# Altium footprint library IntLib.PcbLib: 221 footprints (part 1 of 14)
Each footprint in its own frame and in the unit in brackets; x right, y up, seen from the top. Pads: shape width x height; smd on the part's side, far side on the other; paste and mask are expansions set on the pad; w line width, h text height; cw(c..) or ccw(c..) is an arc to the next point about the centre after c.
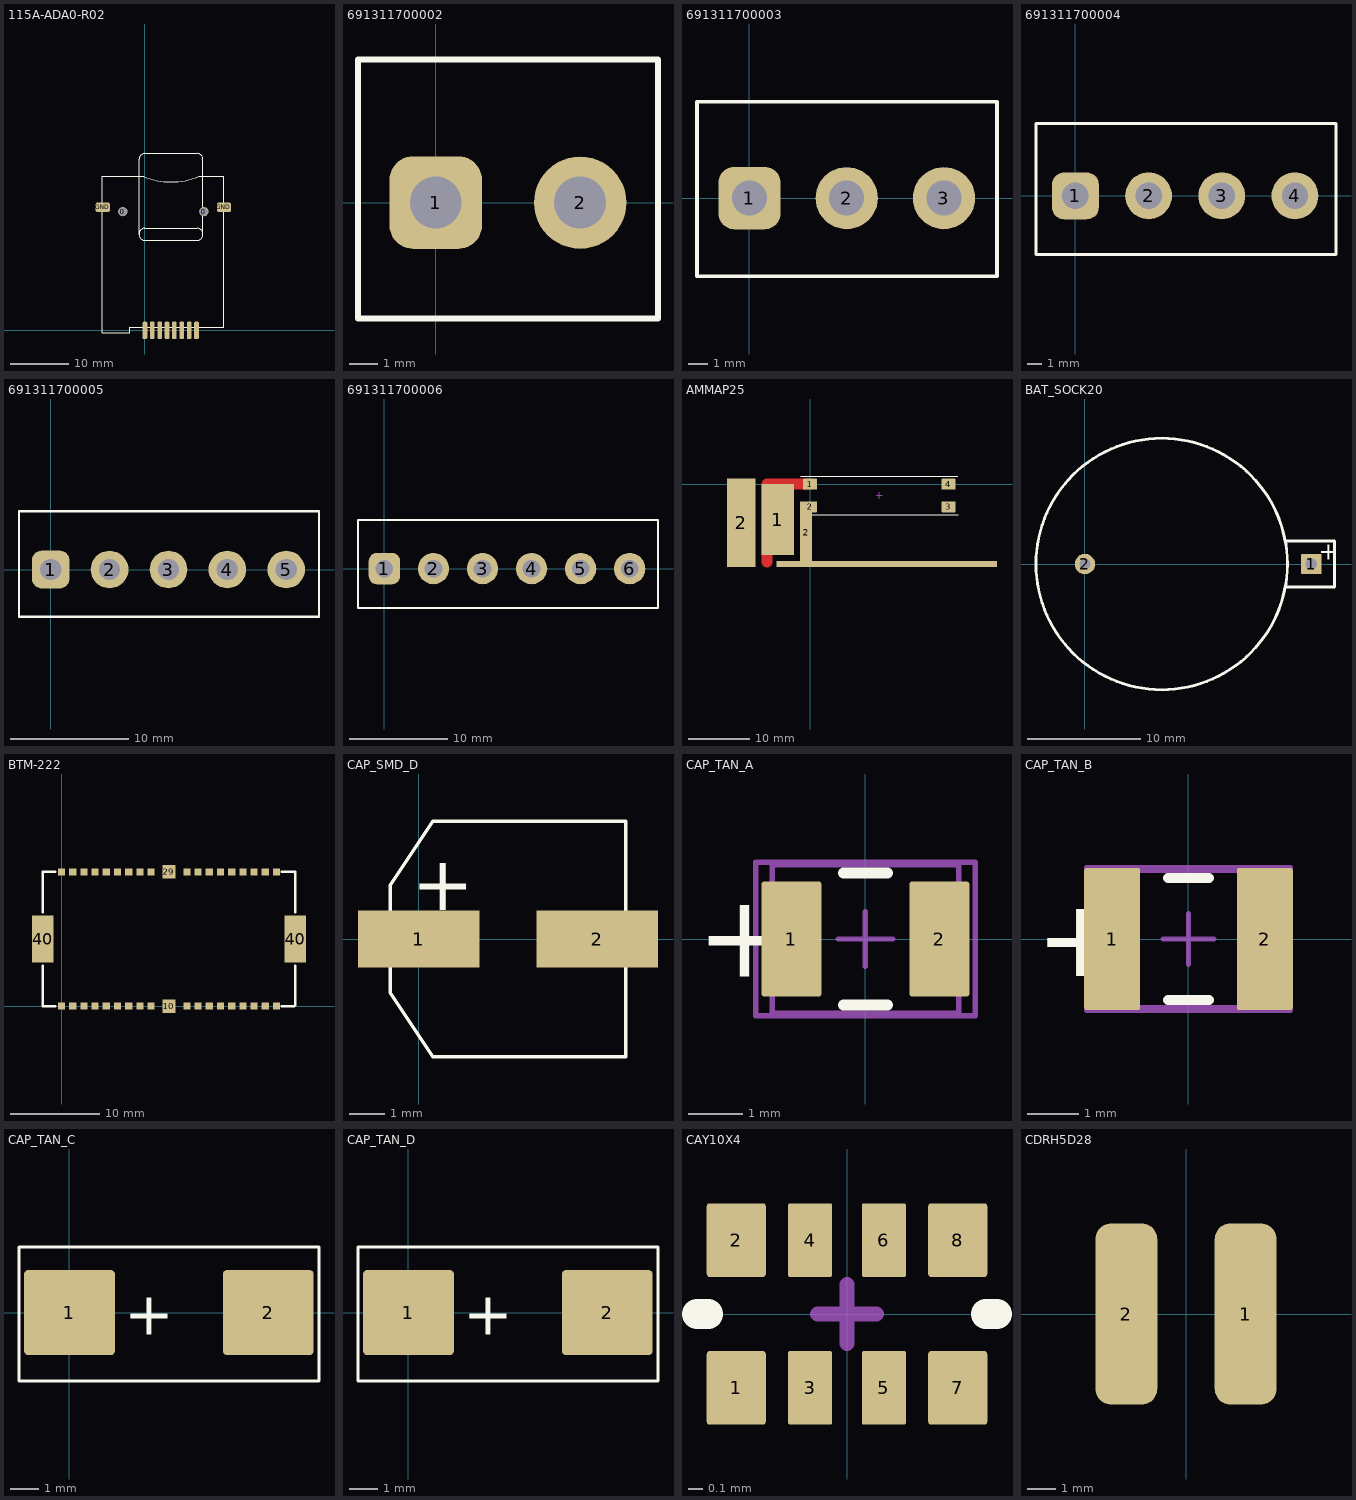
[diagram p0: the footprints below, top view; thin cyan lines are the x and y axes]

## 115A-ADA0-R02 [mm] "Attend SIM-Holder SMD"
height 1.9
pads (12):
  round 1.6 hole 1.5 unplated: 0(-3.83,20.5) 0(10.17,20.5)
  rrect50% 0.8x3 smd: C1(0,0) C2(2.54,0) C3(5.08,0) C5(1.27,0) C6(3.81,0) C7(6.35,0) CD(7.62,0) COM(8.89,0)
  rrect50% 2.5x1.7 smd: GND(-7.3,21.25) GND(13.65,21.25)
Top Overlay:
  lines w0.1: -1,16.645 cw(c0,16.645) 0,17.645 9,17.645 cw(c9,16.645) 10,16.645 ; -7.391,-0.455 -2.591,-0.455 -2.591,0.545 13.64,0.545 13.64,26.568 9.25,26.568 cw(c4.5,37.968) -0.25,26.568 -7.391,26.568 -7.391,-0.455 ; -1,16.545 ccw(c0,16.545) 0,15.545 9,15.545 ccw(c9,16.545) 10,16.545 10,29.545 ccw(c9,29.545) 9,30.545 0,30.545 ccw(c0,29.545) -1,29.545 -1,16.545
3D body: height 1.8, standoff 0, extent -7.31,-0.495 13.64,26.505

## 691311700002 [mm] "WR-TBL Series 3117 - 5.00 mm 2 pins Open Vertical PCB Header"
height 12
pads (2):
  rrect50% 3.2x3.2 hole 1.8: 1(0,0)
  round 3.2 hole 1.8: 2(5,0)
Top Overlay:
  lines w0.2: -2.692,-4.013 -2.692,4.953 7.696,4.953 7.696,-4.013 -2.692,-4.013
  text "." at -2.21,-3.454 h1.27
3D body: height 12, standoff -4, extent -2.511,-3.81 7.489,4.69

## 691311700003 [mm] "WR-TBL Series 3117 - 5.00 mm 3 pins Open Vertical PCB Header"
height 12
pads (3):
  rrect50% 3.2x3.2 hole 1.8: 1(0,0)
  round 3.2 hole 1.8: 2(5,0) 3(10,0)
Top Overlay:
  lines w0.2: -2.692,-4.013 12.725,-4.013 12.725,4.953 -2.692,4.953 -2.692,-4.013
  text "." at -2.21,-3.454 h1.27
3D body: height 12, standoff -4, extent -2.489,-3.759 12.511,4.741

## 691311700004 [mm] "WR-TBL Series 3117 - 5.00 mm 4 pins Open Vertical PCB Header"
height 12
pads (4):
  rrect50% 3.2x3.2 hole 1.8: 1(0,0)
  round 3.2 hole 1.8: 2(5,0) 3(10,0) 4(15,0)
Top Overlay:
  lines w0.2: -2.692,-4.013 17.805,-4.013 17.805,4.953 -2.692,4.953 -2.692,-4.013
  text "." at -2.21,-3.454 h1.27
3D body: height 12, standoff -4, extent -2.464,-3.759 17.536,4.741

## 691311700005 [mm] "WR-TBL Series 3117 - 5.00 mm 5 pins Open Vertical PCB Header"
height 12
pads (5):
  rrect50% 3.2x3.2 hole 1.8: 1(0,0)
  round 3.2 hole 1.8: 2(5,0) 3(10,0) 4(15,0) 5(20,0)
Top Overlay:
  lines w0.2: -2.692,-4.013 -2.692,4.953 22.784,4.953 22.784,-4.013 -2.692,-4.013
  text "." at -2.21,-3.454 h1.27
3D body: height 12, standoff -4, extent -2.464,-3.785 22.536,4.715

## 691311700006 [mm] "WR-TBL Series 3117 - 5.00 mm 6 pins Open Vertical PCB Header"
height 12
pads (6):
  rrect50% 3.2x3.2 hole 1.8: 1(0,0)
  round 3.2 hole 1.8: 2(5,0) 3(10,0) 4(15,0) 5(20,0) 6(25,0)
Top Overlay:
  lines w0.2: -2.692,-4.013 -2.692,4.953 27.889,4.953 27.889,-4.013 -2.692,-4.013
  text "." at -2.21,-3.454 h1.27
3D body: height 12, standoff -4, extent -2.413,-3.759 27.587,4.741

## AMMAP25 [mm] "Chip Antenna; Body 25.0x5.5mm (LxW)"
height 1.016
pads (8):
  rrect2% 5.3x11.6 smd: 1(-5.3,-5.8)
  rrect10% 2.3x1.8 smd: 1(0,0) 2(0,-3.7) 3(22.7,-3.7) 4(22.7,0)
  rrect2% 4.69x14.464 smd: 2(-11.295,-6.332)
  rrect2% 2x10.281 smd: 2(-0.65,-7.94)
  rrect2% 36.136x0.964 smd: 2(12.582,-13.082)
Top Layer:
  lines w1.8: -7.061,-12.725 -7.061,0 0,0
Top Overlay:
  lines w0.2: -1.528,1.325 24.253,1.325 ; -1.477,-5.025 24.304,-5.025
Mechanical 15:
  lines w0.1: 10.85,-1.85 11.85,-1.85 ; 11.35,-2.35 11.35,-1.35
3D body: height 0.6, standoff 0, extent -1.096,-4.517 23.771,0.817
3D body: height 4.3, standoff 0.1, extent -1.096,-4.517 2.968,0.817
3D body: height 4.4, standoff 2.6, extent -1.096,-4.517 23.771,0.817
3D body: height 4.3, standoff 0.1, extent 19.707,-4.517 23.771,0.817

## BAT_SOCK20 [mm]
pads (2):
  rrect10% 1.8x1.8 hole 1: 1(20,-0.005)
  round 1.8 hole 1: 2(0,-0.005)
Top Overlay:
  circle w0.254: c6.779,0 r11.102
  lines w0.254: 17.78,-2.037 22.047,-2.037 22.047,2.027 17.78,2.027
  text "+" at 20.65,0.356 h1.52
3D body: height 7, standoff 3.8, extent -3.226,-9.997 16.774,10.003
3D body: height 8.67, standoff -3.5, extent -4.731,-11.454 22.7,11.546

## BTM-222 [mm]
pads (40):
  rect 0.8x0.8 smd: 1(0,0) 2(1.25,0) 3(2.5,0) 4(3.75,0) 5(5,0) 6(6.25,0) 7(7.5,0) 8(8.75,0) 9(10,0) 11(14,0) 12(15.25,0) 13(16.5,0) 14(17.75,0) 15(19,0) 16(20.25,0) 17(21.5,0) 18(22.75,0) 19(24,0) 20(24,15) 21(22.75,15) 22(21.5,15) 23(20.25,15) 24(19,15) 25(17.75,15) 26(16.5,15) 27(15.25,15) 28(14,15) 30(10,15) 31(8.75,15) 32(7.5,15) 33(6.25,15) 34(5,15) 35(3.75,15) 36(2.5,15) 37(1.25,15) 38(0,15)
  rect 1.5x1.5 smd: 10(12,0) 29(12,15)
  rect 2.4x5.3 smd: 40(-2.1,7.5) 40(26.1,7.5)
Top Overlay:
  lines w0.254: -2.1,4.5 -2.1,0 -0.7,0 ; -2.1,10.5 -2.1,15 -0.7,15 ; 24.6,0 26,0 26.1,0.1 26.1,4.5 ; 24.6,15 26.1,15 26.1,10.5
3D body: height 2.8, standoff -0.05, extent -2.134,0 26.166,15.1

## CAP_SMD_D [mm]
pads (2):
  rect 3.4x1.6 smd: 1(0,0) 2(5,0)
Top Overlay:
  lines w0.1: -0.8,-1.5 -0.8,1.5 0.4,3.3 5.8,3.3 5.8,-3.3 0.4,-3.3 -0.8,-1.5
  text "+" at -0.2,0.8 h1.52
3D body: height 7.71, standoff -0.01, extent -0.985,-3.277 6.015,3.323

## CAP_TAN_A [mm] "Chip Capacitor, Body 3.2x2.5mm, IPC High Density"
height 1.5
pads (2):
  rrect10% 1.1x2.1 smd: 1(-1.35,0) 2(1.35,0)
Top Overlay:
  lines w0.2: -0.4,-1.2 0.4,-1.2 ; -0.4,1.2 0.4,1.2
  text "+" at -3.073,-0.686 h1.52
Mechanical 13:
  lines w0.1: -1.7,-1.35 1.7,-1.35 1.7,1.35 -1.7,1.35 -1.7,-1.35
Mechanical 15:
  lines w0.1: -0.5,0 0.5,0 ; 0,-0.5 0,0.5 ; -2,-1.4 2,-1.4 2,1.4 -2,1.4 -2,-1.4
3D body: height 1.65, standoff 0, extent -1.7,-0.737 1.69,0.863

## CAP_TAN_B [mm] "Chip Capacitor, Body 3.2x2.5mm, IPC High Density"
height 1.5
pads (2):
  rrect10% 1.1x2.8 smd: 1(-1.5,0) 2(1.5,0)
Top Overlay:
  lines w0.2: -0.4,-1.2 0.4,-1.2 ; -0.4,1.2 0.4,1.2
  text "+" at -2.997,-0.737 h1.52
Mechanical 13:
  lines w0.1: -1.7,-1.35 -1.7,1.35 1.7,1.35 1.7,-1.35 -1.7,-1.35
Mechanical 15:
  lines w0.1: -0.5,0 0.5,0 ; 0,-0.5 0,0.5 ; -2,-1.4 -2,1.4 2,1.4 2,-1.4 -2,-1.4
3D body: height 2.14, standoff 0.04, extent -1.753,-1.422 1.938,1.398

## CAP_TAN_C [mm]
pads (2):
  rrect10% 3.2x3 smd: 1(0,0) 2(7,0)
Top Overlay:
  lines w0.1: -1.778,-2.413 -1.778,2.311 8.788,2.311 8.788,-2.413 -1.778,-2.413
  text "+" at 1.93,-0.787 h1.52
3D body: height 3, standoff 0, extent -0.119,-2.24 7.281,2.21

## CAP_TAN_D [mm]
pads (2):
  rrect10% 3.2x3 smd: 1(0,0) 2(7,0)
Top Overlay:
  lines w0.1: -1.778,-2.413 8.788,-2.413 8.788,2.311 -1.778,2.311 -1.778,-2.413
  text "+" at 1.93,-0.787 h1.52
3D body: height 3, standoff 0, extent -0.119,-2.24 7.281,2.21

## CAY10X4 [mm] "Resistor Array x4"
height 2.34
pads (8):
  rrect10% 0.4x0.5 smd: 1(-0.75,-0.5) 2(-0.75,0.5) 7(0.75,-0.5) 8(0.75,0.5)
  rrect10% 0.3x0.5 smd: 3(-0.25,-0.5) 4(-0.25,0.5) 5(0.25,-0.5) 6(0.25,0.5)
Top Overlay:
  lines w0.2: -1.016,0 -0.94,0 ; 0.94,0 1.016,0
Mechanical 3:
  lines w0.1: -0.2,0 0.2,0 ; 0,-0.2 0,0.2
3D body: height 0.4, standoff 0, extent -1,-0.508 1,0.492

## CDRH5D28 [mm] "CDRH5D28"
height 5
pads (2):
  rrect50% 2.15x6.3 smd: 1(2.075,0) 2(-2.075,0)
3D body: height 3, standoff 0, extent -3.025,-3.003 2.975,2.997